# Altium footprint library PJ_GRA_F.PcbLib: 19 footprints (part 2 of 2)
Each footprint in its own frame and in the unit in brackets; x right, y up, seen from the top. Pads: shape width x height; smd on the part's side, far side on the other; paste and mask are expansions set on the pad; w line width, h text height; cw(c..) or ccw(c..) is an arc to the next point about the centre after c.
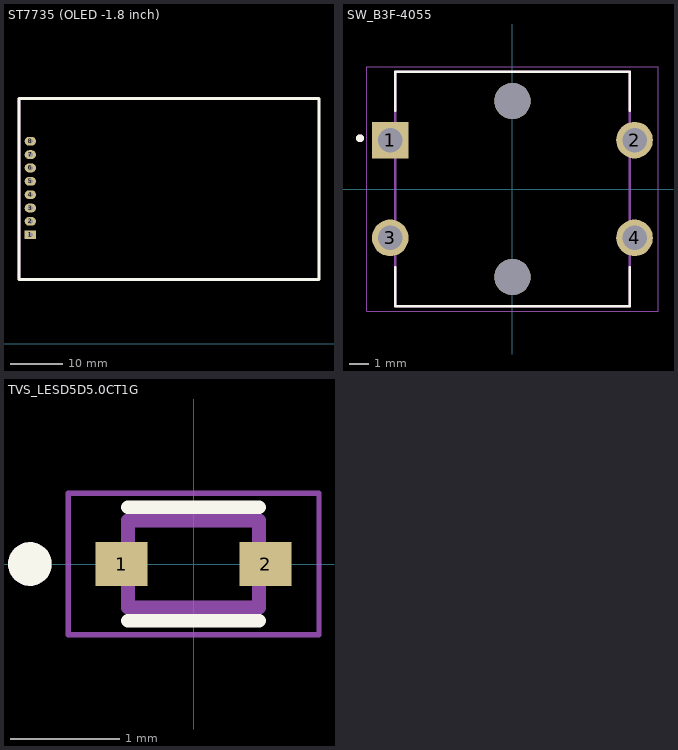
[diagram p1: the footprints below, top view; thin cyan lines are the x and y axes]

## ST7735 (OLED -1.8 inch) [mil]
height 15
pads (8):
  rect 85x65 hole 35.98: 1(530,815)
  oval 85x65 hole 35.98: 2(530,915) 3(530,1015) 4(530,1115) 5(530,1215) 6(530,1315) 7(530,1415) 8(530,1515)
Top Overlay:
  lines w20: 445,480 445,1835 2690,1835 2690,480 445,480
Bottom Overlay:
  lines w20: 445,480 445,1835 2690,1835 2690,480 445,480
Top Courtyard:
  lines w20: 445,480 445,1835
3D body "ST7735 ensamblaje.STEP": height 480.31, standoff -17.72, extent 480,490.71 2676.85,1829.29

## SW_B3F-4055 [mm]
pads (6):
  rect 1.875x1.875 hole 1.25: 1(-6.25,2.5)
  round 1.875 hole 1.25: 2(6.25,2.5) 3(-6.25,-2.5) 4(6.25,-2.5)
  round 1.85 hole 1.85 unplated: ""(0,-4.5) ""(0,4.5)
Top Overlay:
  circle w0.2: c-7.8,2.6 r0.1
  lines w0.127: -6,-4 -6,-6 6,-6 6,-4 ; -6,4 -6,6 6,6 6,4
Bottom Overlay:
  circle w0.2: c-7.642,2.631 r0.1
  lines w0.127: -5.842,-3.969 -5.842,-5.969 6.158,-5.969 6.158,-3.969 ; -5.842,4.031 -5.842,6.031 6.158,6.031 6.158,4.031
Top 3D Body:
  circle w0.2: c-7.8,2.6 r0.1
  lines w0.127: -6,-6 6,-6 6,6 -6,6 -6,-6
Top Courtyard:
  lines w0.05: -7.45,-6.25 7.45,-6.25 7.45,6.25 -7.45,6.25 -7.45,-6.25
3D body "B3F4055BYOMZ--3DModel-STEP-1.STEP": height 10.5, standoff -0.5, extent -6.88,-6 6.881,6

## TVS_LESD5D5.0CT1G [mm]
height 0.7
pads (2):
  rect 0.48x0.4 smd: 1(-0.66,0) 2(0.66,0)
Top Overlay:
  circle w0.2: c-1.5,0 r0.1
  lines w0.127: -0.6,-0.52 0.6,-0.52 ; -0.6,0.52 0.6,0.52
Top 3D Body:
  circle w0.2: c-1.5,0 r0.1
  lines w0.127: -0.6,-0.4 0.6,-0.4 0.6,0.4 -0.6,0.4 -0.6,-0.4
Top Courtyard:
  lines w0.05: -1.15,-0.65 -1.15,0.65 1.15,0.65 1.15,-0.65 -1.15,-0.65
3D body "step_temp.STEP": height 0.7, standoff 0, extent -0.8,-0.4 0.8,0.4